# Altium footprint library Indruino.PcbLib: 383 footprints (part 11 of 24)
Each footprint in its own frame and in the unit in brackets; x right, y up, seen from the top. Pads: shape width x height; smd on the part's side, far side on the other; paste and mask are expansions set on the pad; w line width, h text height; cw(c..) or ccw(c..) is an arc to the next point about the centre after c.
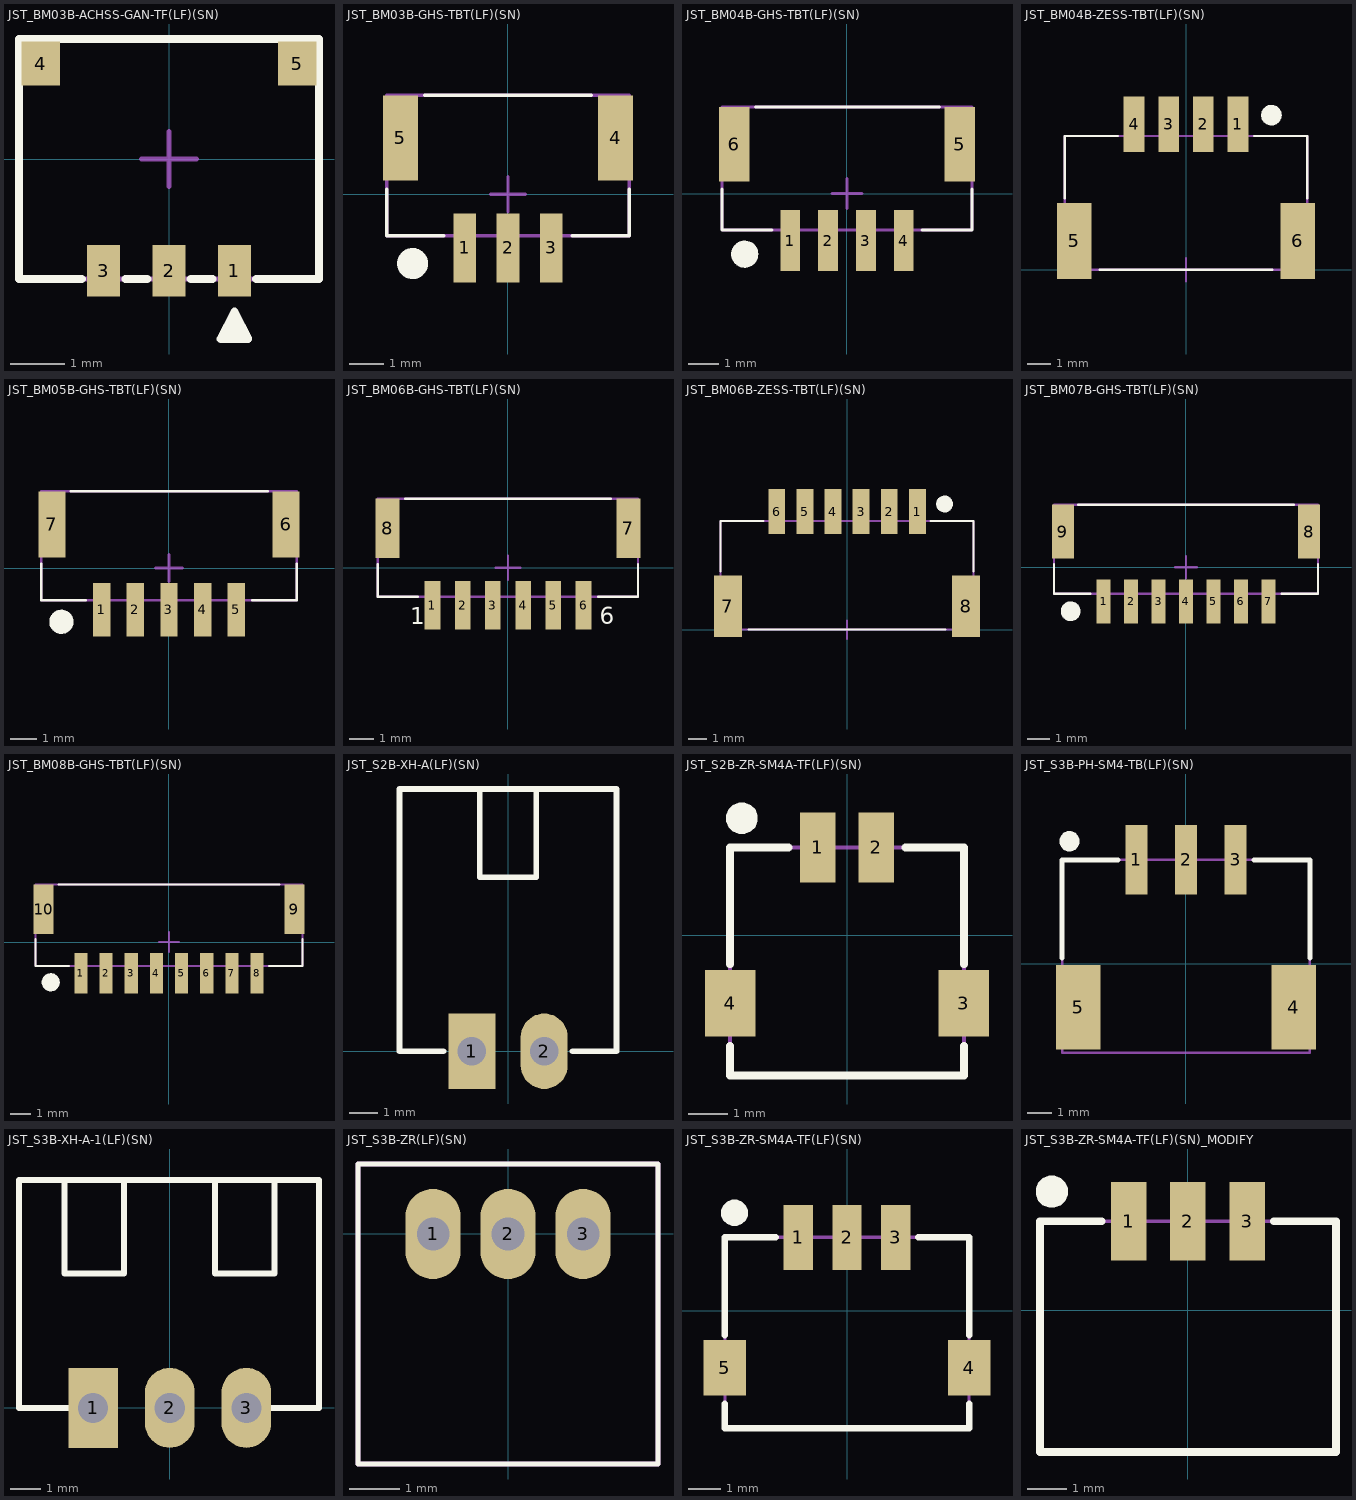
[diagram p10: the footprints below, top view; thin cyan lines are the x and y axes]

## JST_BM03B-ACHSS-GAN-TF(LF)(SN) [mm]
pads (5):
  rect 0.6x0.95 smd: 1(1.2,-2.05) 2(0,-2.05) 3(-1.2,-2.05)
  rect 0.7x0.8 smd: 4(-2.35,1.75) 5(2.35,1.75)
Top Overlay:
  region: 0.95,-3.3 1.45,-3.3 1.2,-2.8
  lines w0.15: -1.6,-2.2 -2.75,-2.2 -2.75,2.2 2.75,2.2 2.75,-2.2 1.6,-2.2 ; -0.8,-2.2 -0.4,-2.2 ; 0.4,-2.2 0.8,-2.2 ; 0.95,-3.3 1.2,-2.8 1.45,-3.3 0.95,-3.3
Mechanical 13:
  lines w0.1: -2.75,-2.2 2.75,-2.2 2.75,2.2 -2.75,2.2 -2.75,-2.2
Mechanical 15:
  lines w0.1: -0.5,0 0.5,0 ; 0,-0.5 0,0.5
3D body "BM03B-ACHSS-GAN-ETF.STEP": height 1.4, standoff -0.05, extent -2.7,-2.15 2.7,2.15

## JST_BM03B-GHS-TBT(LF)(SN) [mm]
pads (5):
  rect 0.65x2 smd: 1(-1.25,-1.55) 2(0,-1.55) 3(1.25,-1.55)
  rect 1x2.45 smd: 4(3.1,1.625) 5(-3.1,1.625)
Top Overlay:
  circle w0.2: c-2.75,-2 r0.35
  region: -2.75,-2.35 -2.82,-2.35 -2.948,-2.297 -3.047,-2.198 -3.1,-2.07 -3.1,-2 -3.1,-1.93 -3.047,-1.802 -2.948,-1.703 -2.82,-1.65 -2.75,-1.65 -2.68,-1.65 -2.552,-1.703 -2.453,-1.802 -2.4,-1.93 -2.4,-2 -2.4,-2.07 -2.453,-2.198 -2.552,-2.297 -2.68,-2.35
  lines w0.1: -3.5,0.15 -3.5,-1.2 -1.85,-1.2 ; -2.4,2.85 2.4,2.85 ; 1.85,-1.2 3.5,-1.2 3.5,0.15
Mechanical 13:
  lines w0.1: -3.5,-1.2 -3.5,2.85 3.5,2.85 3.5,-1.2 -3.5,-1.2
Mechanical 15:
  lines w0.1: -0.5,0 0.5,0 ; 0,-0.5 0,0.5
3D body "GHR-03V-S.STEP": height 7.28, standoff 1.58, extent -2.5,-1.2 2.5,2.95
3D body "BM03B-GHS-TBT.STEP": height 4.18, standoff -0.03, extent -3.5,-2.1 3.5,2.85

## JST_BM04B-GHS-TBT(LF)(SN) [mm]
pads (6):
  rect 0.65x2 smd: 1(-1.875,-1.55) 2(-0.625,-1.55) 3(0.625,-1.55) 4(1.875,-1.55)
  rect 1x2.45 smd: 5(3.725,1.625) 6(-3.725,1.625)
Top Overlay:
  circle w0.2: c-3.375,-2 r0.35
  region: -3.375,-2.35 -3.445,-2.35 -3.573,-2.297 -3.672,-2.198 -3.725,-2.07 -3.725,-2 -3.725,-1.93 -3.672,-1.802 -3.573,-1.703 -3.445,-1.65 -3.375,-1.65 -3.305,-1.65 -3.177,-1.703 -3.078,-1.802 -3.025,-1.93 -3.025,-2 -3.025,-2.07 -3.078,-2.198 -3.177,-2.297 -3.305,-2.35
  lines w0.1: -4.125,0.15 -4.125,-1.2 -2.475,-1.2 ; -3.025,2.85 3.05,2.85 ; 2.475,-1.2 4.125,-1.2 4.125,0.15
Mechanical 13:
  lines w0.1: -4.125,-1.2 4.125,-1.2 4.125,2.85 -4.125,2.85 -4.125,-1.2
Mechanical 15:
  lines w0.1: -0.5,0 0.5,0 ; 0,-0.5 0,0.5
3D body "GHR-04V-S.STEP": height 7.28, standoff 1.59, extent -3.124,-1.201 3.126,2.949
3D body "BM04B-GHS-TBT.STEP": height 4.18, standoff -0.03, extent -4.125,-2.1 4.125,2.85

## JST_BM04B-ZESS-TBT(LF)(SN) [mm]
pads (6):
  rect 0.9x2.4 smd: 1(2.25,6.3) 2(0.75,6.3) 3(-0.75,6.3) 4(-2.25,6.3)
  rect 1.5x3.3 smd: 5(-4.85,1.25) 6(4.85,1.25)
Top Overlay:
  circle w0.2: c3.7,6.7 r0.35
  region: 3.7,6.35 3.63,6.35 3.502,6.403 3.403,6.502 3.35,6.63 3.35,6.7 3.35,6.77 3.403,6.898 3.502,6.997 3.63,7.05 3.7,7.05 3.77,7.05 3.898,6.997 3.997,6.898 4.05,6.77 4.05,6.7 4.05,6.63 3.997,6.502 3.898,6.403 3.77,6.35
  lines w0.1: -5.25,3.1 -5.25,5.8 -2.95,5.8 ; -3.75,0 3.75,0 ; 2.95,5.8 5.25,5.8 5.25,3.1
Mechanical 13:
  lines w0.1: -5.25,0 -5.25,5.8 5.25,5.8 5.25,0 -5.25,0
Mechanical 15:
  lines w0.1: -0.5,0 0.5,0 ; 0,-0.5 0,0.5
3D body "ZER-04V-S.STEP": height 9.35, standoff 1.85, extent -3.9,-0.7 3.9,5
3D body "BM04B-ZESS-TBT.STEP": height 7.6, standoff 0, extent -5.25,0 5.25,7

## JST_BM05B-GHS-TBT(LF)(SN) [mm]
pads (7):
  rect 0.65x2 smd: 1(-2.5,-1.55) 2(-1.25,-1.55) 3(0,-1.55) 4(1.25,-1.55) 5(2.5,-1.55)
  rect 1x2.45 smd: 6(4.35,1.625) 7(-4.35,1.625)
Top Overlay:
  circle w0.2: c-4,-2 r0.35
  region: -4,-2.35 -4.07,-2.35 -4.198,-2.297 -4.297,-2.198 -4.35,-2.07 -4.35,-2 -4.35,-1.93 -4.297,-1.802 -4.198,-1.703 -4.07,-1.65 -4,-1.65 -3.93,-1.65 -3.802,-1.703 -3.703,-1.802 -3.65,-1.93 -3.65,-2 -3.65,-2.07 -3.703,-2.198 -3.802,-2.297 -3.93,-2.35
  lines w0.1: -4.75,0.15 -4.75,-1.2 -3.1,-1.2 ; -3.65,2.85 3.675,2.85 ; 3.1,-1.2 4.75,-1.2 4.75,0.15
Mechanical 13:
  lines w0.1: -4.75,-1.2 4.75,-1.2 4.75,2.85 -4.75,2.85 -4.75,-1.2
Mechanical 15:
  lines w0.1: -0.5,0 0.5,0 ; 0,-0.5 0,0.5
3D body "GHR-05V-S.STEP": height 7.25, standoff 1.55, extent -3.75,-1.2 3.75,2.95
3D body "BM05B-GHS-TBT.STEP": height 4.18, standoff -0.03, extent -4.75,-2.1 4.75,2.85

## JST_BM06B-GHS-TBT(LF)(SN) [mm]
pads (8):
  rect 0.65x2 smd: 1(-3.125,-1.55) 2(-1.875,-1.55) 3(-0.625,-1.55) 4(0.625,-1.55) 5(1.875,-1.55) 6(3.125,-1.55)
  rect 1x2.45 smd: 7(4.975,1.625) 8(-4.975,1.625)
Top Overlay:
  lines w0.1: -5.375,0.15 -5.375,-1.2 -3.725,-1.2 ; -4.25,2.85 4.25,2.85 ; 3.725,-1.2 5.375,-1.2 5.375,0.15
  text "1" at -4.05,-2.35 h0.7
  text "6" at 3.8,-2.35 h0.7
Mechanical 13:
  lines w0.1: -5.375,-1.2 -5.375,2.85 5.375,2.85 5.375,-1.2 -5.375,-1.2
Mechanical 15:
  lines w0.1: -0.5,0 0.5,0 ; 0,-0.5 0,0.5
3D body "BM06B-GHS-TBT.STEP": height 4.18, standoff -0.03, extent -5.375,-2.1 5.375,2.85
3D body "GHR-06V-S.STEP": height 7.3, standoff 1.6, extent -4.374,-1.2 4.376,2.95

## JST_BM06B-ZESS-TBT(LF)(SN) [mm]
pads (8):
  rect 0.9x2.4 smd: 1(3.75,6.3) 2(2.25,6.3) 3(0.75,6.3) 4(-0.75,6.3) 5(-2.25,6.3) 6(-3.75,6.3)
  rect 1.5x3.3 smd: 7(-6.35,1.25) 8(6.35,1.25)
Top Overlay:
  circle w0.2: c5.2,6.7 r0.35
  region: 5.2,6.35 5.13,6.35 5.002,6.403 4.903,6.502 4.85,6.63 4.85,6.7 4.85,6.77 4.903,6.898 5.002,6.997 5.13,7.05 5.2,7.05 5.27,7.05 5.398,6.997 5.497,6.898 5.55,6.77 5.55,6.7 5.55,6.63 5.497,6.502 5.398,6.403 5.27,6.35
  lines w0.1: -6.75,3.1 -6.75,5.8 -4.45,5.8 ; -5.25,0 5.25,0 ; 4.45,5.8 6.75,5.8 6.75,3.1
Mechanical 13:
  lines w0.1: -6.75,0 -6.75,5.8 6.75,5.8 6.75,0 -6.75,0
Mechanical 15:
  lines w0.1: -0.5,0 0.5,0 ; 0,-0.5 0,0.5
3D body "BM06B-ZESS-TBT.STEP": height 7.6, standoff 0, extent -6.75,0 6.75,7
3D body "ZER-06V-S.STEP": height 9.35, standoff 1.85, extent -5.4,-0.7 5.4,5

## JST_BM07B-GHS-TBT(LF)(SN) [mm]
pads (9):
  rect 0.65x2 smd: 1(-3.75,-1.55) 2(-2.5,-1.55) 3(-1.25,-1.55) 4(0,-1.55) 5(1.25,-1.55) 6(2.5,-1.55) 7(3.75,-1.55)
  rect 1x2.45 smd: 8(5.6,1.625) 9(-5.6,1.625)
Top Overlay:
  circle w0.2: c-5.25,-2 r0.35
  region: -5.25,-2.35 -5.32,-2.35 -5.448,-2.297 -5.547,-2.198 -5.6,-2.07 -5.6,-2 -5.6,-1.93 -5.547,-1.802 -5.448,-1.703 -5.32,-1.65 -5.25,-1.65 -5.18,-1.65 -5.052,-1.703 -4.953,-1.802 -4.9,-1.93 -4.9,-2 -4.9,-2.07 -4.953,-2.198 -5.052,-2.297 -5.18,-2.35
  lines w0.1: -6,0.15 -6,-1.2 -4.35,-1.2 ; -4.9,2.85 4.9,2.85 ; 4.35,-1.2 6,-1.2 6,0.15
Mechanical 13:
  lines w0.1: -6,-1.2 -6,2.85 6,2.85 6,-1.2 -6,-1.2
Mechanical 15:
  lines w0.1: -0.5,0 0.5,0 ; 0,-0.5 0,0.5
3D body "BM07B-GHS-TBT.STEP": height 4.18, standoff -0.03, extent -6,-2.1 6,2.85
3D body "GHR-07V-S.STEP": height 7.25, standoff 1.55, extent -5,-1.2 5,2.95

## JST_BM08B-GHS-TBT(LF)(SN) [mm]
pads (10):
  rect 0.65x2 smd: 1(-4.375,-1.55) 2(-3.125,-1.55) 3(-1.875,-1.55) 4(-0.625,-1.55) 5(0.625,-1.55) 6(1.875,-1.55) 7(3.125,-1.55) 8(4.375,-1.55)
  rect 1x2.45 smd: 9(6.225,1.625) 10(-6.225,1.625)
Top Overlay:
  circle w0.2: c-5.875,-2 r0.35
  region: -5.875,-2.35 -5.945,-2.35 -6.073,-2.297 -6.172,-2.198 -6.225,-2.07 -6.225,-2 -6.225,-1.93 -6.172,-1.802 -6.073,-1.703 -5.945,-1.65 -5.875,-1.65 -5.805,-1.65 -5.677,-1.703 -5.578,-1.802 -5.525,-1.93 -5.525,-2 -5.525,-2.07 -5.578,-2.198 -5.677,-2.297 -5.805,-2.35
  lines w0.1: -6.625,0.15 -6.625,-1.2 -4.975,-1.2 ; -5.5,2.85 5.5,2.85 ; 4.975,-1.2 6.625,-1.2 6.625,0.15
Mechanical 13:
  lines w0.1: -6.625,-1.2 6.625,-1.2 6.625,2.85 -6.625,2.85 -6.625,-1.2
Mechanical 15:
  lines w0.1: -0.5,0 0.5,0 ; 0,-0.5 0,0.5
3D body "BM08B-GHS-TBT.STEP": height 4.18, standoff -0.03, extent -6.625,-2.1 6.625,2.85
3D body "GHR-08V-S.STEP": height 7.28, standoff 1.58, extent -5.625,-1.2 5.625,2.95

## JST_S2B-XH-A(LF)(SN) [mm]
pads (2):
  rect 1.65x2.65 hole 1: 1(-1.27,0)
  oval 1.65x2.65 hole 1: 2(1.27,0)
Top Overlay:
  lines w0.2: -2.26,0 -3.81,0 -3.81,9.2 3.81,9.2 3.81,0 2.26,0 ; -0.99,9.2 -0.99,6.1 0.99,6.1 0.99,9.2
3D body "S2B-XH-A.STEP": height 5.95, standoff -3.4, extent -3.7,-2.3 3.7,9.2

## JST_S2B-ZR-SM4A-TF(LF)(SN) [mm]
pads (4):
  rect 0.9x1.8 smd: 1(-0.75,2.25) 2(0.75,2.25)
  rect 1.3x1.7 smd: 3(3,-1.75) 4(-3,-1.75)
Top Overlay:
  region: -2.7,2.6 -2.78,2.6 -2.927,2.661 -3.039,2.773 -3.1,2.92 -3.1,3 -3.1,3.08 -3.039,3.227 -2.927,3.339 -2.78,3.4 -2.7,3.4 -2.62,3.4 -2.473,3.339 -2.361,3.227 -2.3,3.08 -2.3,3 -2.3,2.92 -2.361,2.773 -2.473,2.661 -2.62,2.6
  lines w0.2: -3,-2.85 -3,-3.6 3,-3.6 3,-2.85 ; -3,-0.75 -3,2.25 -1.5,2.25 ; 1.5,2.25 3,2.25 3,-0.75
Mechanical 13:
  lines w0.1: -3,-3.585 -3,2.25 3,2.25 3,-3.585 -3,-3.585
3D body "S2B-ZR-SM4A-TF.STEP": height 3.7, standoff 0, extent -3,-3.6 3,2.9
3D body "ZHR-2.STEP": height 3.7, standoff 0.3, extent -2.25,-5.05 2.25,-0.25

## JST_S3B-PH-SM4-TB(LF)(SN) [mm]
pads (5):
  rect 0.9x2.8 smd: 1(-2,4.2) 2(0,4.2) 3(2,4.2)
  rect 1.8x3.4 smd: 4(4.35,-1.75) 5(-4.35,-1.75)
Top Overlay:
  region: -4.7,4.55 -4.78,4.55 -4.927,4.611 -5.039,4.723 -5.1,4.87 -5.1,4.95 -5.1,5.03 -5.039,5.177 -4.927,5.289 -4.78,5.35 -4.7,5.35 -4.62,5.35 -4.473,5.289 -4.361,5.177 -4.3,5.03 -4.3,4.95 -4.3,4.87 -4.361,4.723 -4.473,4.611 -4.62,4.55
  lines w0.2: -5,0.25 -5,4.2 -2.75,4.2 ; 2.75,4.2 5,4.2 5,0.25
Mechanical 13:
  lines w0.1: -5,4.1 -5,-3.585 5,-3.585 5,4.1 ; -5,4.2 5,4.2
3D body "S3B-PH-SM4-TB.STEP": height 5.6, standoff 0, extent -4.95,-3.45 4.95,5.15

## JST_S3B-XH-A-1(LF)(SN) [mm]
pads (3):
  rect 1.65x2.65 hole 1: 1(-2.54,0)
  oval 1.65x2.65 hole 1: 2(0,0) 3(2.54,0)
Top Overlay:
  lines w0.2: -3.49,7.55 -3.49,4.45 -1.51,4.45 -1.51,7.55 ; -2.26,0 -5,0 -5,7.55 4.95,7.55 4.95,0 2.26,0 ; 1.5,7.55 1.5,4.45 3.48,4.45 3.48,7.55
3D body "S3B-XH-A-1.STEP": height 6.1, standoff -3.45, extent -4.95,-3.95 4.95,7.55

## JST_S3B-ZR(LF)(SN) [mm]
pads (3):
  oval 1.1x1.8 hole 0.65: 1(-1.5,0) 2(0,0) 3(1.5,0)
Top Overlay:
  lines w0.1: -3,-4.6 3,-4.6 3,1.4 -3,1.4 -3,-4.6
Mechanical 13:
  lines w0.1: -3,-4.6 3,-4.6 3,1.4 -3,1.4 -3,-4.6
3D body "ZHR-3.STEP": height 3.65, standoff 0.25, extent -3,-6.05 3,-1.25
3D body "S3B-ZR.STEP": height 3.7, standoff -2.7, extent -3,-4.6 3,1.4

## JST_S3B-ZR-SM4A-TF(LF)(SN) [mm]
pads (5):
  rect 0.9x2 smd: 1(-1.5,2.25) 2(0,2.25) 3(1.5,2.25)
  rect 1.3x1.7 smd: 4(3.75,-1.75) 5(-3.75,-1.75)
Top Overlay:
  region: -3.45,2.6 -3.53,2.6 -3.677,2.661 -3.789,2.773 -3.85,2.92 -3.85,3 -3.85,3.08 -3.789,3.227 -3.677,3.339 -3.53,3.4 -3.45,3.4 -3.37,3.4 -3.223,3.339 -3.111,3.227 -3.05,3.08 -3.05,3 -3.05,2.92 -3.111,2.773 -3.223,2.661 -3.37,2.6
  lines w0.2: -3.75,-2.85 -3.75,-3.6 3.75,-3.6 3.75,-2.85 ; -3.75,-0.75 -3.75,2.25 -2.19,2.25 ; 2.18,2.25 3.75,2.25 3.75,-0.75
Mechanical 13:
  lines w0.1: -3.745,-3.585 3.745,-3.585 3.745,2.25 -3.745,2.25 -3.745,-3.585
3D body "ZHR-3.STEP": height 3.35, standoff -0.05, extent -3.006,-5.051 2.994,-0.251
3D body "S3B-ZR-SM4A_TF.stp": height 3.7, standoff 0, extent -3.755,-3.575 3.745,2.925

## JST_S3B-ZR-SM4A-TF(LF)(SN)_MODIFY [mm]
pads (3):
  rect 0.9x2 smd: 1(-1.5,2.25) 2(0,2.25) 3(1.5,2.25)
Top Overlay:
  region: -3.45,2.6 -3.53,2.6 -3.677,2.661 -3.789,2.773 -3.85,2.92 -3.85,3 -3.85,3.08 -3.789,3.227 -3.677,3.339 -3.53,3.4 -3.45,3.4 -3.37,3.4 -3.223,3.339 -3.111,3.227 -3.05,3.08 -3.05,3 -3.05,2.92 -3.111,2.773 -3.223,2.661 -3.37,2.6
  lines w0.2: -2.19,2.25 -3.75,2.25 -3.75,-3.6 3.75,-3.6 3.75,2.25 2.18,2.25
Mechanical 13:
  lines w0.1: -3.745,-3.585 -3.745,2.25 3.745,2.25 3.745,-3.585 -3.745,-3.585
3D body "S3B-ZR-SM4A_TF.stp": height 3.7, standoff 0, extent -3.755,-3.575 3.745,2.925
3D body "ZHR-3.STEP": height 3.35, standoff -0.05, extent -3.006,-5.051 2.994,-0.251